# Altium footprint library hphonglib.PcbLib: 703 footprints (part 26 of 44)
Each footprint in its own frame and in the unit in brackets; x right, y up, seen from the top. Pads: shape width x height; smd on the part's side, far side on the other; paste and mask are expansions set on the pad; w line width, h text height; cw(c..) or ccw(c..) is an arc to the next point about the centre after c.
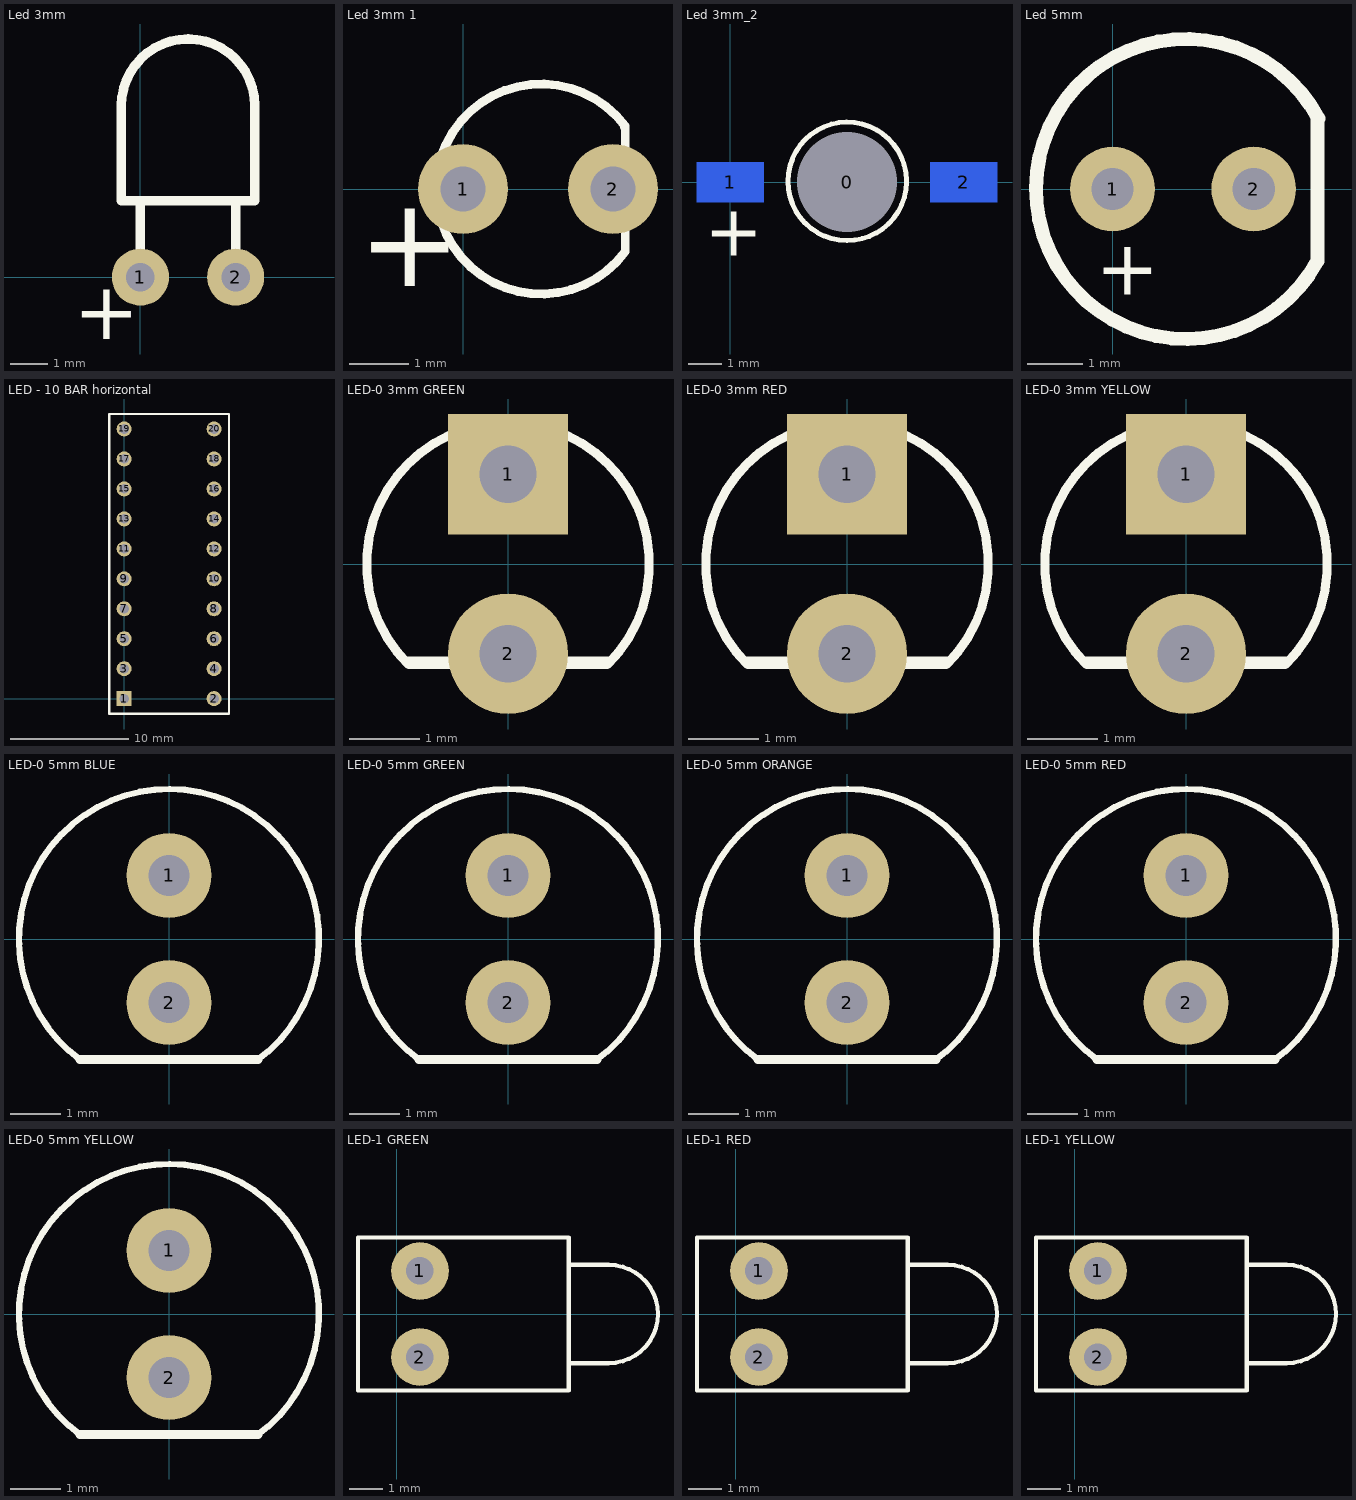
[diagram p25: the footprints below, top view; thin cyan lines are the x and y axes]

## Led 3mm [mil] "Led 3mm nam"
pads (2):
  round 60 hole 30: 1(0,0) 2(100,0)
Top Overlay:
  lines w10: 0,5 0,80 ; 100,0 100,80 ; -20,80 -20,180 cw(c50,180) 120,180 120,80 -20,80
  text "+" at -70,-65 h60
3D body: height 86.55, standoff 70.87, extent 6.89,-4.92 22.61,113.19
3D body: height 86.55, standoff 70.87, extent 77.76,-4.92 93.47,113.19
3D body: height 82.68, standoff -39.37, extent 5.92,-6.89 21.64,8.8
3D body: height 82.68, standoff -39.37, extent 77.77,-6.89 93.49,8.8
3D body: height 117.8, standoff 39.37, extent 11.06,87.6 89.64,205.71
3D body: height 118.11, standoff 39.37, extent 11.24,165.69 89.57,244.09
3D body: height 137.33, standoff 19.69, extent -8.63,75.79 109.25,115.16

## Led 3mm 1 [mil] "Led 3mm"
pads (2):
  round 60 hole 30: 1(0,0) 2(100,0)
Top Overlay:
  lines w3.94: 106.75,41.11 108.7,41.11 108.2,41.11
  lines w5.91: 108.01,42.05 ccw(c52.05,0) 108.2,-41.79 108.2,41.11
  text "+" at -70,-65 h60
3D body: height 82.68, standoff -39.37, extent 73.82,-7.87 89.54,7.81
3D body: height 82.68, standoff -39.37, extent 10.84,-7.87 26.56,7.81
3D body: height 255.91, standoff 137.8, extent -7.57,-60.52 109.93,57.09
3D body: height 196.85, standoff 78.74, extent -7.64,-60.04 110,57.84
3D body: height 98.43, standoff 59.06, extent -16.73,-70.87 108.27,69.88

## Led 3mm_2 [mm] "Led 3mm"
pads (3):
  round 2 hole 3 paste+0 mask+0: 0(3.5,0)
  rect 2x1.2 smd far side: 1(0,0) 2(7,0)
Top Overlay:
  lines w0.1: 4.896,1.07 4.945,1.07 4.933,1.07
  lines w0.15: 5.284,0.001 cw(c3.506,0.025) 5.284,0.052
  text "+" at -0.762,-2.21 h1.52
3D body: height -0.5, standoff -1.5, extent 1.895,-1.673 5.07,1.902
3D body: height 2, standoff -1, extent 2.037,-1.524 5.025,1.47
3D body: height 3.5, standoff 0.5, extent 2.064,-1.666 5.048,1.321

## Led 5mm [mil] "Led 5mm"
pads (2):
  round 60 hole 30: 1(0,0) 2(100,0)
Top Overlay:
  lines w9.84: 145.32,49.54 145.32,-50.99 cw(c52.05,0) 145.93,49.86
  text "+" at -11.81,-74.8 h39.37
3D body: height 82.68, standoff -39.37, extent 11.83,-6.89 27.54,8.8
3D body: height 82.68, standoff -39.37, extent 74.8,-6.89 90.52,8.8
3D body: height 82.68, standoff -39.37, extent -2.94,-7.87 12.78,7.81
3D body: height 98.43, standoff 59.06, extent -54.13,-106.3 145.67,106.3
3D body: height 196.85, standoff 78.74, extent -28.23,-79.41 128.63,77.76
3D body: height 275.59, standoff 118.11, extent -28.13,-80.04 128.53,76.77

## LED - 10 BAR horizontal [mil]
pads (20):
  rect 50x50 hole 32: 1(0,0)
  round 50 hole 32: 2(300,0) 3(0,100) 4(300,100) 5(0,200) 6(300,200) 7(0,300) 8(300,300) 9(0,400) 10(300,400) 11(0,500) 12(300,500) 13(0,600) 14(300,600) 15(0,700) 16(300,700) 17(0,800) 18(300,800) 19(0,900) 20(300,900)
Top Overlay:
  lines w8: -50,-50 350,-50 350,950 -50,950 -50,-50
Bottom Overlay:
  lines w10: -51.18,-51.18 349.41,-51.18 349.41,947.83 350.39,947.83 -51.18,947.83 -51.18,-51.18
3D body: height 236.61, standoff 232.28, extent 32.48,-30.91 266.73,35.04
3D body: height 236.61, standoff 232.28, extent 32.48,69.09 266.73,135.04
3D body: height 236.61, standoff 232.28, extent 32.48,169.09 266.73,235.04
3D body: height 236.61, standoff 232.28, extent 32.48,269.09 266.73,335.04
3D body: height 236.61, standoff 232.28, extent 32.48,369.09 266.73,435.04
3D body: height 236.61, standoff 232.28, extent 32.48,469.09 266.73,535.04
3D body: height 236.61, standoff 232.28, extent 32.48,569.09 266.73,635.04
3D body: height 236.61, standoff 232.28, extent 32.48,669.09 266.73,735.04
3D body: height 236.61, standoff 232.28, extent 32.48,769.09 266.73,835.04
3D body: height 236.61, standoff 232.28, extent 32.48,869.09 266.73,935.04
3D body: height 236.22, standoff 0, extent -46.89,-49.21 351.38,949.37

## LED-0 3mm GREEN [mil] "Typical LED; GREEN; RED; 2 Leads; Solder Pad 35mil"
pads (2):
  rect 67x67 hole 32: 1(0,50)
  round 67 hole 32: 2(0,-50)
Top Overlay:
  lines w5: -55.68,-55.68 cw(c0,0) 55.68,-55.68
  lines w7: -55,-55 55,-55
3D body: height 207.04, standoff -107.93, extent -63.57,-65.51 65.91,64.42

## LED-0 3mm RED [mil] "Typical LED; RED; 2 Leads; Solder Pad 35mil"
pads (2):
  rect 67x67 hole 32: 1(0,50)
  round 67 hole 32: 2(0,-50)
Top Overlay:
  lines w5: -55.68,-55.68 cw(c0,0) 55.68,-55.68
  lines w7: -55,-55 55,-55
3D body: height 207.04, standoff -107.93, extent -63.57,-65.51 65.91,64.42

## LED-0 3mm YELLOW [mil] "Typical LED; YELLOW; RED; 2 Leads; Solder Pad 35mil"
pads (2):
  rect 67x67 hole 32: 1(0,50)
  round 67 hole 32: 2(0,-50)
Top Overlay:
  lines w5: -55.68,-55.68 cw(c0,0) 55.68,-55.68
  lines w7: -55,-55 55,-55
3D body: height 207.04, standoff -107.93, extent -63.57,-65.51 65.91,64.42

## LED-0 5mm BLUE [mil] "Typical LED; BLUE; 2 Leads; Solder Pad 35mil"
pads (2):
  round 67 hole 32: 1(0,50) 2(0,-50)
Top Overlay:
  lines w5: -70.06,-95.09 cw(c0,0) 69.15,-95.75
  lines w7: -70,-95 70,-95
3D body: height 344.75, standoff -237.93, extent -118,-96.19 118.99,117.2

## LED-0 5mm GREEN [mil] "Typical LED; GREEN; 2 Leads; Solder Pad 35mil"
pads (2):
  round 67 hole 32: 1(0,50) 2(0,-50)
Top Overlay:
  lines w5: -70.06,-95.09 cw(c0,0) 69.15,-95.75
  lines w7: -70,-95 70,-95
3D body: height 344.75, standoff -237.93, extent -118,-96.19 118.99,117.2

## LED-0 5mm ORANGE [mil] "Typical LED; ORANGE; 2 Leads; Solder Pad 35mil"
pads (2):
  round 67 hole 32: 1(0,50) 2(0,-50)
Top Overlay:
  lines w5: -70.06,-95.09 cw(c0,0) 69.15,-95.75
  lines w7: -70,-95 70,-95
3D body: height 344.75, standoff -237.93, extent -118,-96.19 118.99,117.2

## LED-0 5mm RED [mil] "Typical LED; RED; 2 Leads; Solder Pad 35mil"
pads (2):
  round 67 hole 32: 1(0,50) 2(0,-50)
Top Overlay:
  lines w5: -70.06,-95.09 cw(c0,0) 69.15,-95.75
  lines w7: -70,-95 70,-95
3D body: height 344.75, standoff -237.93, extent -118,-96.19 118.99,117.2

## LED-0 5mm YELLOW [mil] "Typical LED; YELLOW; 2 Leads; Solder Pad 35mil"
pads (2):
  round 67 hole 32: 1(0,50) 2(0,-50)
Top Overlay:
  lines w5: -70.06,-95.09 cw(c0,0) 69.15,-95.75
  lines w7: -70,-95 70,-95
3D body: height 344.75, standoff -237.93, extent -118,-96.19 118.99,117.2

## LED-1 GREEN [mil] "Typical LED; GREEN; 2 Leads; Solder Pad 35mil"
pads (2):
  round 67 hole 32: 1(27,50) 2(27,-50)
Top Overlay:
  lines w5: 203.23,-57.09 246.54,-57.09 ccw(c246.54,0) 246.54,57.09 203.23,57.09 ; -45,-89 200,-89 200,89 -45,89 -45,-89
3D body: height 287.9, standoff -97.93, extent -47.43,-91 297.43,91

## LED-1 RED [mil] "Typical LED; RED; 2 Leads; Solder Pad 35mil"
pads (2):
  round 67 hole 32: 1(27,50) 2(27,-50)
Top Overlay:
  lines w5: 203.23,-57.09 246.54,-57.09 ccw(c246.54,0) 246.54,57.09 203.23,57.09 ; -45,-89 200,-89 200,89 -45,89 -45,-89
3D body: height 287.9, standoff -97.93, extent -47.43,-91 297.43,91

## LED-1 YELLOW [mil] "Typical LED; YELLOW; 2 Leads; Solder Pad 35mil"
pads (2):
  round 67 hole 32: 1(27,50) 2(27,-50)
Top Overlay:
  lines w5: 203.23,-57.09 246.54,-57.09 ccw(c246.54,0) 246.54,57.09 203.23,57.09 ; -45,-89 200,-89 200,89 -45,89 -45,-89
3D body: height 287.9, standoff -97.93, extent -47.43,-91 297.43,91